# Altium schematic symbol library lib_datalogger.SchLib: 1246 symbols (part 6 of 16)
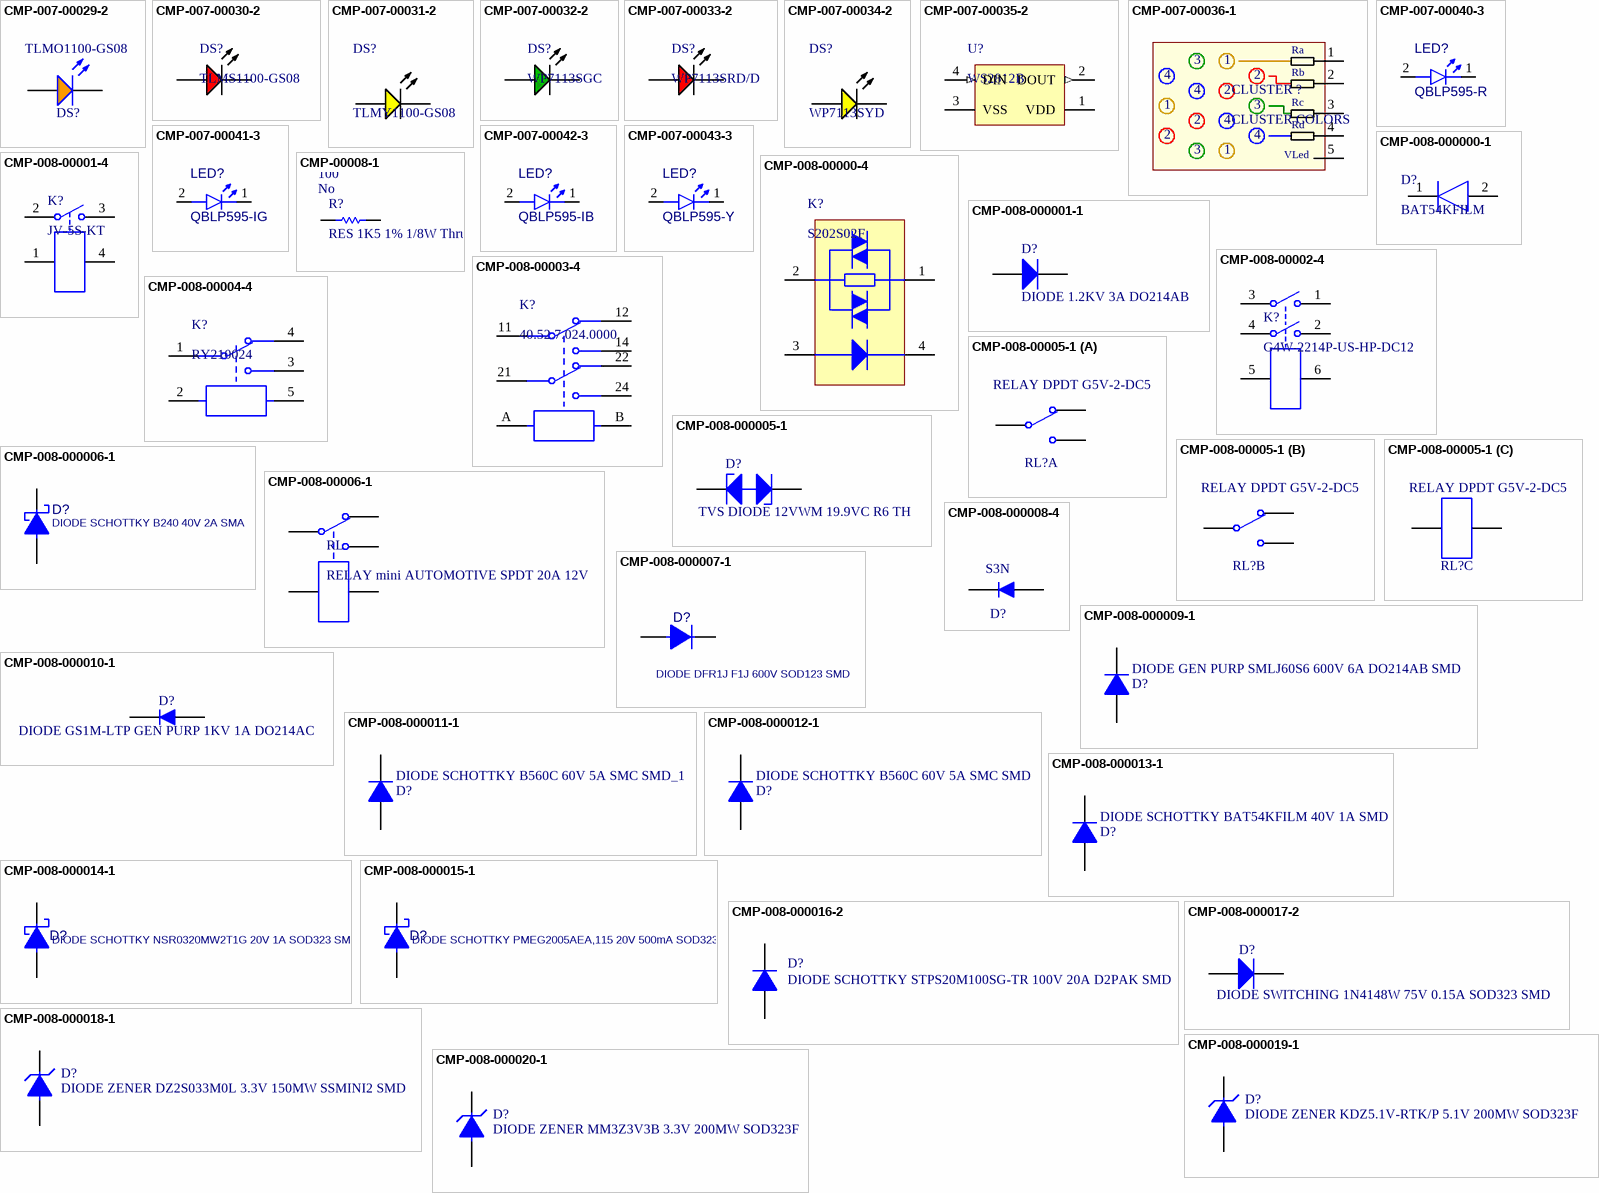
[diagram p48: symbols CMP-007-00029-2 to CMP-008-000020-1]

## CMP-008-000017-2
designator D?, comment DIODE SWITCHING 1N4148W 75V 0.15A SOD323 SMD
DIODE GEN PURP 75V 150MA SOD323; Manufacturer: Micro Commercial Co; Manufacturer Part Number: 1N4148WX-TP; Polarity: Standard; Reverse Recovery Time: 4ns; Power Dissipation: 500mW; Voltage - Forward (Vf) (Max) @ If: 1V @ 50mA; Current - Reverse Leakage @ Vr: 5µA @ 75V; Power Rating: 200mW; Peak Non-Repetitive Surge Current: 350mA; Max Repetitive Reverse Voltage (Vrrm): 100V; Max Reverse Current: 100uA; Speed: Small Signal =< 200mA (Io), Any Speed; Element Configuration: Single; Capacitance: 2pF; Forward Voltage: 1.2V; Forward Current: 150mA; ComponentLink6Description: https://datasheet.ciiva.com/28513/1749643-28513431.pdf?src-supplier=Element14; ComponentLink13Description: https://datasheet.ciiva.com/911/ds30097-911741.pdf?src-supplier=Digi-Key; ComponentLink1Description: http://www.mccsemi.com/up_pdf/1N4148WX(SOD323).pdf; ComponentLink5Description: https://datasheet.ciiva.com/29593/1n4148ws-29593110.pdf?src-supplier=Digi-Key; Weight: 0.000152oz; Package Quantity: 3000; ComponentLink13URL: https://datasheet.ciiva.com/911/ds30097-911741.pdf?src-supplier=Digi-Key; Current - Average Rectified (Io): 150mA; Voltage Rating (DC): 75V; Supplier Device Package: SOD-323; ComponentLink10Description: https://datasheet.ciiva.com/16472/ds30097-16472599.pdf?src-supplier=Avnet+Asia; Current Rating: 150mA; ComponentLink14Description: https://datasheet.ciiva.com/911/ds30097-911742.pdf?src-supplier=Digi-Key; Max Operating Temperature: 150°C; RoHS: RoHS Compliant; Pricing 2: 3000=0,03390, 6000=0,02700, 12000=0,02300, 1=0,11530, 10=0,10420, 25=0,09810, 100=0,06020, 250=0,05940, 500=0,05090, 1000=0,04270, 3000=0,02700 (USD); Packaging: Cut Tape (CT); REACH SVHC: Unknown; ComponentLink11URL: https://datasheet.ciiva.com/1179/ds30097-1179355.pdf?src-supplier=Element14; Lead Free: Lead Free; ComponentLink7Description: https://datasheet.ciiva.com/29885/1n4148ws-29885946.pdf?src-supplier=Avnet; Number of Pins: 2; Recovery Time: 4ns; ComponentLink12URL: https://datasheet.ciiva.com/8300/ds30097-8300396.pdf?src-supplier=Avnet; Radiation Hardening: No; Voltage: 75V; ComponentLink16URL: https://datasheet.ciiva.com/911/ds30097-911743.pdf?src-supplier=Digi-Key; ComponentLink11Description: https://datasheet.ciiva.com/1179/ds30097-1179355.pdf?src-supplier=Element14; Reverse Recovery Time (trr): 4ns; Width: 1.5mm; Category: Discrete Semiconductor Products; ComponentLink15Description: https://datasheet.ciiva.com/25946/ds30097-25946926.pdf?src-supplier=Avnet+Europe; ComponentLink10URL: https://datasheet.ciiva.com/16472/ds30097-16472599.pdf?src-supplier=Avnet+Asia; ComponentLink14URL: https://datasheet.ciiva.com/911/ds30097-911742.pdf?src-supplier=Digi-Key; Capacitance @ Vr, F: -; Design Item ID: DIODE SWITCHING 1N4148W 75V 0.15A SOD323 SMD; Diode Type: Standard; Height: 1.05mm; ComponentLink15URL: https://datasheet.ciiva.com/25946/ds30097-25946926.pdf?src-supplier=Avnet+Europe; ComponentLink8URL: https://datasheet.ciiva.com/24156/1n4148ws-24156957.pdf?src-supplier=Future+Electronics; ComponentLink12Description: https://datasheet.ciiva.com/8300/ds30097-8300396.pdf?src-supplier=Avnet; ComponentLink6URL: https://datasheet.ciiva.com/28513/1749643-28513431.pdf?src-supplier=Element14; ComponentLink3URL: https://datasheet.ciiva.com/26946/getdatasheetpartid-790118-26946365.pdf?src-supplier=Verical; ComponentLink9URL: https://datasheet.ciiva.com/16199/ds30097-16199061.pdf?src-supplier=Future+Electronics; Part Status: Active; ComponentLink2Description: https://datasheet.ciiva.com/28513/1749643-28513441.pdf?src-supplier=Element14; Stock 1: 606017; ComponentLink9Description: https://datasheet.ciiva.com/16199/ds30097-16199061.pdf?src-supplier=Future+Electronics; Average Rectified Current: 150mA; Pricing 1: 1=0,17000, 10=0,14500, 100=0,06860, 500=0,04068, 1000=0,02731 (USD); Output Current: 150mA; Contact Plating: Tin; ComponentLink8Description: https://datasheet.ciiva.com/24156/1n4148ws-24156957.pdf?src-supplier=Future+Electronics; Operating Temperature - Junction: -55°C ~ 150°C; Length: 1.95mm; Mounting Type: Surface Mount; Max Forward Surge Current (Ifsm): 350mA; Package / Case: SC-76, SOD-323; Max Power Dissipation: 200mW; Min Operating Temperature: -55°C; Voltage - DC Reverse (Vr) (Max): 75V; Source: mits.SchLib; Max Reverse Voltage (DC): 75V; Case/Package: SMA; ComponentLink3Description: https://datasheet.ciiva.com/26946/getdatasheetpartid-790118-26946365.pdf?src-supplier=Verical; ComponentLink4URL: https://datasheet.ciiva.com/29593/1n4148ws-29593109.pdf?src-supplier=Digi-Key; Max Surge Current: 350mA; Max Reverse Leakage Current: 100uA; ComponentLink1URL: http://www.mccsemi.com/up_pdf/1N4148WX(SOD323).pdf; ComponentLink7URL: https://datasheet.ciiva.com/29885/1n4148ws-29885946.pdf?src-supplier=Avnet; ComponentLink4Description: https://datasheet.ciiva.com/29593/1n4148ws-29593109.pdf?src-supplier=Digi-Key; Stock 2: 12000; ComponentLink16Description: https://datasheet.ciiva.com/911/ds30097-911743.pdf?src-supplier=Digi-Key; Mount: Surface Mount; ComponentLink5URL: https://datasheet.ciiva.com/29593/1n4148ws-29593110.pdf?src-supplier=Digi-Key; ComponentLink2URL: https://datasheet.ciiva.com/28513/1749643-28513441.pdf?src-supplier=Element14
footprint SOD-323
footprint SOD-323
pins: A, K

## CMP-008-000018-1
designator D?, comment DIODE ZENER DZ2S033M0L 3.3V 150MW SSMINI2 SMD
DIODE ZENER 3.3V 150MW SSMINI2; Manufacturer: Panasonic Electronic Components; Voltage - Forward (Vf) (Max) @ If: 1V @ 10mA; Impedance (Max) (Zzt): 130 Ohm; Tolerance: ±2.5%; Current - Reverse Leakage @ Vr: 20µA @ 1V; Voltage - Zener (Nom) (Vz): 3.3V; Manufacturer Part Number: DZ2S033M0L; Operating Temperature: -; Category: Discrete Semiconductor Products; ComponentLink1URL: http://www.semicon.panasonic.co.jp/ds4/DZ2S033_E.pdf; Design Item ID: DIODE ZENER DZ2S033M0L 3.3V 150MW SSMINI2 SMD; RoHS: RoHS Compliant; ComponentLink1Description: http://www.semicon.panasonic.co.jp/ds4/DZ2S033_E.pdf; Part Status: Active; Mounting Type: Surface Mount; Supplier Device Package: SSMini2-F5-B; Stock 1: 9938; Pricing 1: 1=0.1, 10=0.044, 25=0.0356, 100=0.0277, 250=0.02692, 500=0.02614, 1000=0.02376 (USD); Package / Case: SC-79, SOD-523; Power - Max: 150mW; Packaging: Cut Tape (CT); Source: mits.SchLib
footprint SOD-323
footprint SC-79, SOD-523
pins: A "Anode", K "Catode"

## CMP-008-000019-1
designator D?, comment DIODE ZENER KDZ5.1V-RTK/P 5.1V 200MW SOD323F
DIODE ZENER 5.1V 200MW SOD323F; Manufacturer 1: KEC; Impedance: 70R; Zener Current: 5mA; Peak Reverse Current: 1.5uA; Voltage Tolerance: 2.16%; Height: 1.05mm; Length: 2.5mm; ComponentLink1Description: https://datasheet.lcsc.com/szlcsc/KEC-Semicon-KDZ5-1V-RTK-P_C155471.pdf; Design Item ID: DIODE ZENER KDZ5.1V-RTK/P 5.1V 200MW SOD323F; Category: Zener Diodes; RoHS: Yes; Min Operating Temperature: -55°C; Power Rating: 200mW; Manufacturer Part Number 1: KDZ5.1V-RTK/P; Source: mits.SchLib; Max Operating Temperature: 150°C; Number of Pins: 2; Termination: SMD/SMT; Width: 1.3mm; REACH SVHC: No SVHC; Max Power Dissipation: 200mW; Case/Package: SOD-323F; Max Reverse Leakage Current: 1.5uA; ComponentLink1URL: https://datasheet.lcsc.com/szlcsc/KEC-Semicon-KDZ5-1V-RTK-P_C155471.pdf; Mount: Surface Mount; Zener Voltage: 5.1V
footprint SOD-323
footprint SOD-323
pins: A "Anode", K "Catode"

## CMP-008-000020-1
designator D?, comment DIODE ZENER MM3Z3V3B 3.3V 200MW SOD323F
DIODE ZENER 3.3V 200MW SOD323F; Manufacturer: Fairchild/ON Semiconductor; Voltage - Forward (Vf) (Max) @ If: 1V @ 10mA; Impedance (Max) (Zzt): 89 Ohm; Current - Reverse Leakage @ Vr: 4.5µA @ 1V; Tolerance: ±2%; Pricing 1: 1=0.2, 10=0.18, 100=0.098, 500=0.06028, 1000=0.0411 (USD); RoHS: RoHS Compliant; Source: mits.SchLib; Stock 1: 42346; Manufacturer Part Number: MM3Z3V3B; Voltage - Zener (Nom) (Vz): 3.3V; Part Status: Active; Operating Temperature: -65°C ~ 150°C; Mounting Type: Surface Mount; Design Item ID: DIODE ZENER MM3Z3V3B 3.3V 200MW SOD323F; Package / Case: SC-90, SOD-323F; Power - Max: 200mW; Category: Discrete Semiconductor Products; ComponentLink1Description: https://www.fairchildsemi.com/datasheets/MM/MM3Z10VB.pdf; Supplier Device Package: SOD-323F; Packaging: Cut Tape (CT); ComponentLink1URL: https://www.fairchildsemi.com/datasheets/MM/MM3Z10VB.pdf
footprint SOD-323
footprint SOD-323
pins: A "Anode", K "Catode"

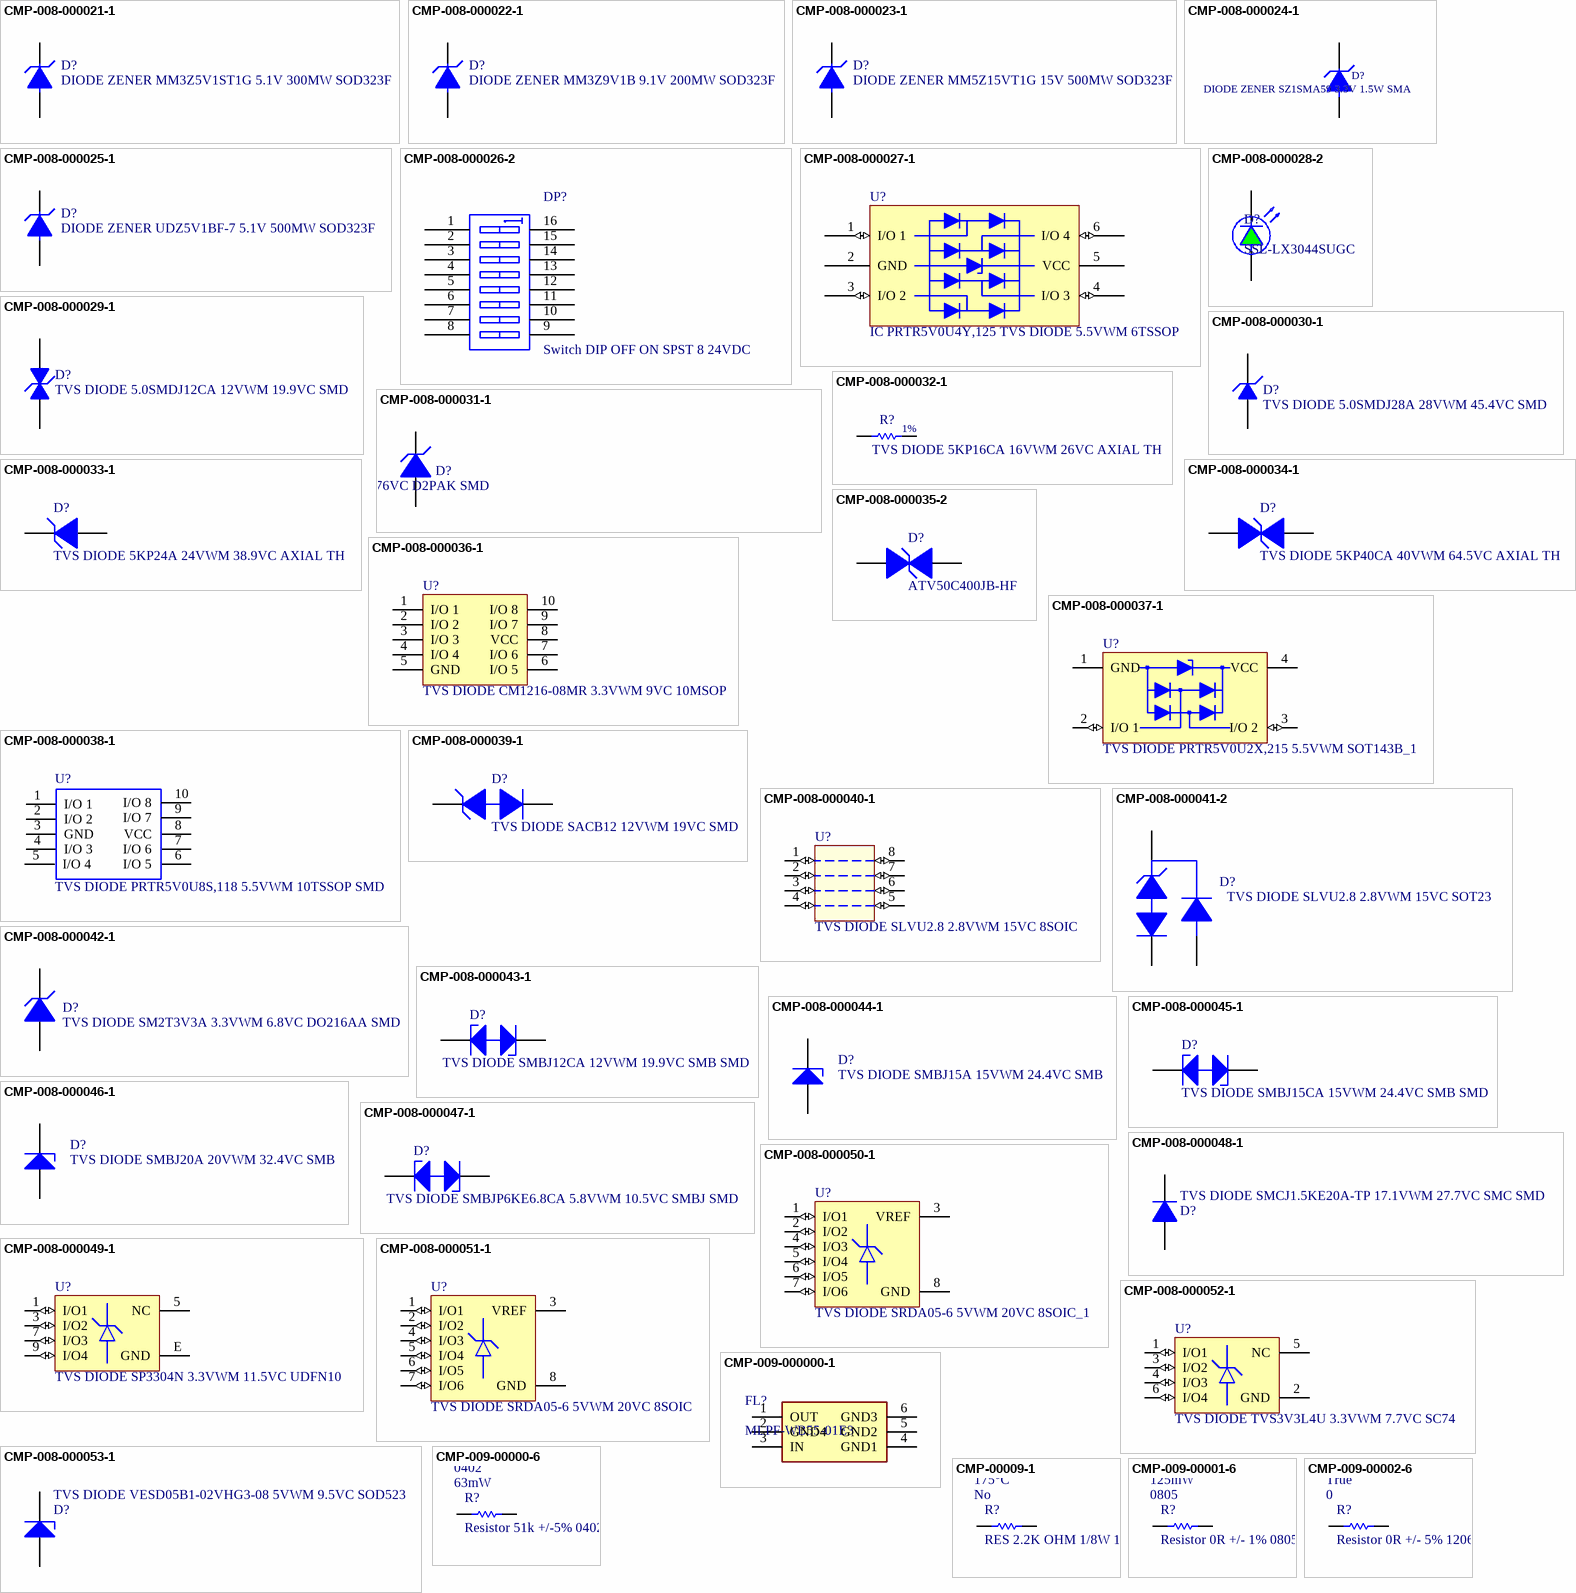
[diagram p16: symbols CMP-008-000021-1 to CMP-009-00002-6]

## CMP-008-000021-1
designator D?, comment DIODE ZENER MM3Z5V1ST1G 5.1V 300MW SOD323F
DIODE ZENER 5.1V 300MW SOD323; Manufacturer: ON Semiconductor; Voltage Tolerance: 2%; Forward Voltage: 900mV; Max Power Dissipation: 200mW; Zener Current: 10mA; Impedance: 60R; ESD Protection: Yes; Element Configuration: Single; Max Reverse Leakage Current: 2uA; Zener Voltage: 5.09V; Test Current: 5mA; Material: Plastic; ComponentLink5URL: https://datasheet.ciiva.com/16473/mm3z2v4st1-d-16473517.pdf?src-supplier=Avnet+Asia; ComponentLink3URL: https://datasheet.ciiva.com/894/mm3z2v4st1-d-894648.pdf?src-supplier=Digi-Key; ComponentLink4Description: https://datasheet.ciiva.com/22626/1878251-22626906.pdf?src-supplier=Element14; Stock 1: 140661; ComponentLink4URL: https://datasheet.ciiva.com/22626/1878251-22626906.pdf?src-supplier=Element14; ComponentLink5Description: https://datasheet.ciiva.com/16473/mm3z2v4st1-d-16473517.pdf?src-supplier=Avnet+Asia; Package Quantity: 3000; Radiation Hardening: No; Source: mits.SchLib; REACH SVHC: No SVHC; Power Dissipation: 200mW; Width: 1.35mm; Length: 1.8mm; Power Rating: 200mW; ComponentLink9URL: https://datasheet.ciiva.com/22626/1878251-22626909.pdf?src-supplier=Element14; Packaging: Tape and Reel; Max Operating Temperature: 150°C; ComponentLink9Description: https://datasheet.ciiva.com/22626/1878251-22626909.pdf?src-supplier=Element14; Height: 1mm; Voltage Rating (DC): 5.1V; RoHS: Yes; ComponentLink8Description: https://datasheet.ciiva.com/16397/mm3z2v4st1-d-16397690.pdf?src-supplier=Future+Electronics; Design Item ID: DIODE ZENER MM3Z5V1ST1G 5.1V 300MW SOD323F; ComponentLink7URL: https://datasheet.ciiva.com/25928/mm3z2v4st1-d-25928233.pdf?src-supplier=Avnet+Europe; ComponentLink1URL: https://datasheet.ciiva.com/10630/mm3z2v4st1-d-10630224.pdf?src-supplier=Avnet; Manufacturer Part Number: MM3Z5V1ST1G; ComponentLink6Description: https://datasheet.ciiva.com/894/mm3z2v4st1-d-894647.pdf?src-supplier=Digi-Key; ComponentLink2URL: https://datasheet.ciiva.com/894/mm3z2v4st1-d-894646.pdf?src-supplier=Digi-Key; ComponentLink1Description: https://datasheet.ciiva.com/10630/mm3z2v4st1-d-10630224.pdf?src-supplier=Avnet; Lead Free: Lead Free; Case/Package: SOD-323-2; Number of Pins: 2; Pricing 1: 1=0,13000, 10=0,12200, 100=0,05100, 500=0,04004, 1000=0,02781 (USD); Category: Zener Diodes; ComponentLink8URL: https://datasheet.ciiva.com/16397/mm3z2v4st1-d-16397690.pdf?src-supplier=Future+Electronics; ComponentLink2Description: https://datasheet.ciiva.com/894/mm3z2v4st1-d-894646.pdf?src-supplier=Digi-Key; ComponentLink7Description: https://datasheet.ciiva.com/25928/mm3z2v4st1-d-25928233.pdf?src-supplier=Avnet+Europe; ComponentLink6URL: https://datasheet.ciiva.com/894/mm3z2v4st1-d-894647.pdf?src-supplier=Digi-Key; Working Voltage: 5.1V; Contact Plating: Tin,Matte; Min Operating Temperature: -65°C; ComponentLink3Description: https://datasheet.ciiva.com/894/mm3z2v4st1-d-894648.pdf?src-supplier=Digi-Key; Peak Reverse Current: 2uA; Tolerance: 2%
footprint SOD-323
footprint SOD-323
pins: A "Anode", K "Catode"

## CMP-008-000022-1
designator D?, comment DIODE ZENER MM3Z9V1B 9.1V 200MW SOD323F
DIODE ZENER 9.1V 200MW SOD323F; Manufacturer: Fairchild/ON Semiconductor; Test Current: 5mA; Max Reverse Leakage Current: 450nA; Element Configuration: Single; Current - Reverse Leakage @ Vr: 4.5µA @ 6V; Tolerance: ±2%; Voltage Tolerance: 2%; Impedance: 14R; Voltage - Forward (Vf) (Max) @ If: 1V @ 10mA; Impedance (Max) (Zzt): 14 Ohms; ComponentLink1Description: https://www.fairchildsemi.com/datasheets/MM/MM3Z10VB.pdf; ComponentLink5Description: https://datasheet.ciiva.com/889/mm3z10vb-889110.pdf?src-supplier=Digi-Key; Source: mits.SchLib; Stock 2: 230; Operating Temperature: -65°C ~ 150°C; Package Quantity: 1; Min Operating Temperature: -65°C; Pricing 1: 1=0,24000, 10=0,19400, 100=0,10270, 500=0,06758, 1000=0,04595 (USD); Max Power Dissipation: 200mW; Category: Discrete Semiconductor Products; ComponentLink4URL: https://datasheet.ciiva.com/10639/mm3z9v1b-10639643.pdf?src-supplier=Avnet; ComponentLink3Description: https://datasheet.ciiva.com/889/mm3z10vb-889112.pdf?src-supplier=Digi-Key; Part Status: Active; Package / Case: SC-90, SOD-323F; Mount: Surface Mount; Radiation Hardening: No; Max Operating Temperature: 150°C; Number of Pins: 2; RoHS Compliant: Yes; Design Item ID: DIODE ZENER MM3Z9V1B 9.1V 200MW SOD323F; ComponentLink2URL: https://datasheet.ciiva.com/4732/mm3z9v1b-186818-4732865.pdf?src-supplier=Mouser; Power Dissipation: 200mW; ComponentLink6Description: https://datasheet.ciiva.com/889/mm3z10vb-889111.pdf?src-supplier=Digi-Key; Width: 1.7mm; Pricing 2: 1=0,24000, 10=0,19400, 100=0,10270, 500=0,06758, 1000=0,04595 (USD); ComponentLink6URL: https://datasheet.ciiva.com/889/mm3z10vb-889111.pdf?src-supplier=Digi-Key; RoHS: RoHS Compliant; Length: 1.3mm; Height: 1mm; Voltage - Zener (Nom) (Vz): 9.1V; Manufacturer Part Number: MM3Z9V1B; Packaging: Cut Tape (CT); Supplier Device Package: SOD-323F; ComponentLink1URL: https://www.fairchildsemi.com/datasheets/MM/MM3Z10VB.pdf; Series: MM3Z9; Stock 1: 230; ComponentLink4Description: https://datasheet.ciiva.com/10639/mm3z9v1b-10639643.pdf?src-supplier=Avnet; ComponentLink5URL: https://datasheet.ciiva.com/889/mm3z10vb-889110.pdf?src-supplier=Digi-Key; Power - Max: 200mW; Mounting Type: Surface Mount; ComponentLink2Description: https://datasheet.ciiva.com/4732/mm3z9v1b-186818-4732865.pdf?src-supplier=Mouser; ComponentLink3URL: https://datasheet.ciiva.com/889/mm3z10vb-889112.pdf?src-supplier=Digi-Key; Zener Voltage: 9.1V; REACH SVHC: No SVHC; Weight: 0.0276g
footprint SOD-323
footprint SOD-323
pins: A "Anode", K "Catode"

## CMP-008-000023-1
designator D?, comment DIODE ZENER MM5Z15VT1G 15V 500MW SOD323F
Diode Zener Single 14.7V 5% 550mW Automotive 2-Pin SOD-323F T/R; Manufacturer: ON Semiconductor; Max Reverse Leakage Current: 50nA; Material: Plastic; ESD Protection: Yes; Zener Current: 10mA; Power Rating: 100mW; Impedance: 30R; Max Power Dissipation: 200mW; Forward Voltage: 900mV; Test Current: 5mA; ComponentLink12URL: https://datasheet.ciiva.com/892/bzx84j-ser-892483.pdf?src-supplier=Digi-Key; Voltage Rating (DC): 15V; Packaging: Tape and Reel; Voltage Tolerance: 5%; Width: 0.9mm; Voltage: 15V; Package Quantity: 3000; RoHS: Yes; ComponentLink7URL: https://datasheet.ciiva.com/895/mm5z2v4t1-d-895143.pdf?src-supplier=Digi-Key; Max Reverse Current: 50nA; ComponentLink7Description: https://datasheet.ciiva.com/895/mm5z2v4t1-d-895143.pdf?src-supplier=Digi-Key; ComponentLink8URL: https://datasheet.ciiva.com/895/mm5z2v4t1-d-895144.pdf?src-supplier=Digi-Key; ComponentLink2URL: https://datasheet.ciiva.com/15142/getdatasheetpartid-39000-15142029.pdf?src-supplier=Verical; ComponentLink1Description: https://www.fairchildsemi.com/datasheets/MM/MM3Z10VB.pdf; ComponentLink8Description: https://datasheet.ciiva.com/895/mm5z2v4t1-d-895144.pdf?src-supplier=Digi-Key; Tolerance: 5%; Number of Pins: 2; Pricing 2: 1=0,23000, 10=0,19000, 100=0,10070, 500=0,06626, 1000=0,04506 (USD); ComponentLink13URL: https://datasheet.ciiva.com/16473/bzx84j-ser-16473676.pdf?src-supplier=Avnet+Asia; Working Voltage: 15V; ComponentLink13Description: https://datasheet.ciiva.com/16473/bzx84j-ser-16473676.pdf?src-supplier=Avnet+Asia; ComponentLink10URL: https://datasheet.ciiva.com/892/bzx84j-ser-892482.pdf?src-supplier=Digi-Key; ComponentLink12Description: https://datasheet.ciiva.com/892/bzx84j-ser-892483.pdf?src-supplier=Digi-Key; Case/Package: SOD-523-2; Stock 2: 5714; ComponentLink4Description: https://datasheet.ciiva.com/26092/mm5z2v4t1-d-26092189.pdf?src-supplier=Avnet+Europe; REACH SVHC: No SVHC; Max Operating Temperature: 150°C; ComponentLink3Description: https://datasheet.ciiva.com/16206/mm5z2v4t1-d-16206007.pdf?src-supplier=Future+Electronics; ComponentLink11URL: https://datasheet.ciiva.com/892/bzx84j-ser-892481.pdf?src-supplier=Digi-Key; ComponentLink3URL: https://datasheet.ciiva.com/16206/mm5z2v4t1-d-16206007.pdf?src-supplier=Future+Electronics; ComponentLink4URL: https://datasheet.ciiva.com/26092/mm5z2v4t1-d-26092189.pdf?src-supplier=Avnet+Europe; Zener Voltage: 15V; Length: 1.3mm; ComponentLink5Description: https://datasheet.ciiva.com/4731/mm5z2v4t1-d-4731183.pdf?src-supplier=Mouser; ComponentLink10Description: https://datasheet.ciiva.com/892/bzx84j-ser-892482.pdf?src-supplier=Digi-Key; Power Dissipation: 200mW; ComponentLink5URL: https://datasheet.ciiva.com/4731/mm5z2v4t1-d-4731183.pdf?src-supplier=Mouser; ComponentLink6Description: https://datasheet.ciiva.com/895/mm5z2v4t1-d-895142.pdf?src-supplier=Digi-Key; Mount: Surface Mount; Source: mits.SchLib; Design Item ID: DIODE ZENER MM5Z15VT1G 15V 500MW SOD323F; Peak Reverse Current: 50nA; Radiation Hardening: No; ComponentLink9URL: https://datasheet.ciiva.com/8347/mm5z2v4t1-d-8347806.pdf?src-supplier=Avnet; ComponentLink11Description: https://datasheet.ciiva.com/892/bzx84j-ser-892481.pdf?src-supplier=Digi-Key; Height: 0.7mm; Element Configuration: Single; Lead Free: Lead Free; Pricing 1: 1=0,22000, 10=0,17700, 100=0,07250, 500=0,06048, 1000=0,04202 (USD); Manufacturer Part Number: MM5Z15VT1G; ComponentLink9Description: https://datasheet.ciiva.com/8347/mm5z2v4t1-d-8347806.pdf?src-supplier=Avnet; ComponentLink2Description: https://datasheet.ciiva.com/15142/getdatasheetpartid-39000-15142029.pdf?src-supplier=Verical; ComponentLink6URL: https://datasheet.ciiva.com/895/mm5z2v4t1-d-895142.pdf?src-supplier=Digi-Key; Min Operating Temperature: -65°C; Category: Zener Diodes; ComponentLink1URL: https://www.fairchildsemi.com/datasheets/MM/MM3Z10VB.pdf; Contact Plating: Tin,Matte; Stock 1: 107647
footprint SOD-323
footprint SOD-323
pins: A "Anode", K "Catode"

## CMP-008-000024-1
designator D?, comment DIODE ZENER SZ1SMA59 3.3V 1.5W SMA
ON SEMICONDUCTOR - SZ1SMA5918BT3G - Zener Single Diode, 5.1 V, 1.5 W, DO-214AC, 5 %, 2 Pins, 150 °C; Voltage Tolerance: 5%; Impedance: 4R; Zener Voltage: 5.1V; Max Reverse Leakage Current: 2.5uA; Pricing 1: 1=0,30890, 10=0,23150, 30=0,21740, 100=0,20320, 500=0,19690, 1000=0,19380, 1=0,29600, 10=0,22180, 30=0,20830, 100=0,19460, 500=0,18860, 1000=0,18560, 1=1,55170, 10=1,16300, 30=1,09200, 100=1,02050, 500=0,98890, 1000=0,97320, 1=1,48840, 10=1,11550, 30=1,04750, 100=0,97880, 500=0,94860, 1000=0,93350, 1=0,20010, 10=0,14990, 30=0,14080, 100=0,13160, 500=0,12750, 1000=0,12550, 1=0,17000, 10=0,12740, 30=0,11960, 100=0,11180, 500=0,10830, 1000=0,10660, 1=1,83740, 10=1,37710, 30=1,29310, 100=1,20830, 500=1,17100, 1000=1,15240, 1=26,04950, 10=19,52330, 30=18,33270, 100=17,13110, 500=16,60200, 1000=16,33740, 1=0,97730, 10=0,73250, 30=0,68780, 100=0,64270, 500=0,62290, 1000=0,61300, 1=18,08770, 10=13,55620, 30=12,72950, 100=11,89520, 500=11,52770, 1000=11,34400, 1=2,05790, 10=1,54240, 30=1,44830, 100=1,35340, 500=1,31160, 1000=1,29070, 1=0,31700, 10=0,23760, 30=0,22310, 100=0,20850, 500=0,20200, 1000=0,19880, 1=0,23630, 10=0,17710, 30=0,16630, 100=0,15540, 500=0,15060, 1000=0,14820 (AUD); Radiation Hardening: No; Series: -; ComponentLink1URL: https://datasheet.ciiva.com/354/1sma5913bt3-d-354340.pdf?src-supplier=Digi-Key; Lead Free: Lead Free; ComponentLink1Description: https://datasheet.ciiva.com/354/1sma5913bt3-d-354340.pdf?src-supplier=Digi-Key; ComponentLink2Description: https://datasheet.ciiva.com/13076/1sma5913bt3-d-13076302.pdf?src-supplier=Mouser; Stock 1: 5455; Tolerance: 5%; Package Quantity: 5000; Category: Zener Diodes; Min Operating Temperature: -65°C; Element Configuration: Single; Pricing 2: 1=0,30890, 10=0,23150, 30=0,21740, 100=0,20320, 500=0,19690, 1000=0,19380, 1=0,29600, 10=0,22180, 30=0,20830, 100=0,19460, 500=0,18860, 1000=0,18560, 1=1,55170, 10=1,16300, 30=1,09200, 100=1,02050, 500=0,98890, 1000=0,97320, 1=1,48840, 10=1,11550, 30=1,04750, 100=0,97880, 500=0,94860, 1000=0,93350, 1=0,20010, 10=0,14990, 30=0,14080, 100=0,13160, 500=0,12750, 1000=0,12550, 1=0,17000, 10=0,12740, 30=0,11960, 100=0,11180, 500=0,10830, 1000=0,10660, 1=1,83740, 10=1,37710, 30=1,29310, 100=1,20830, 500=1,17100, 1000=1,15240, 1=26,04950, 10=19,52330, 30=18,33270, 100=17,13110, 500=16,60200, 1000=16,33740, 1=0,97730, 10=0,73250, 30=0,68780, 100=0,64270, 500=0,62290, 1000=0,61300, 1=18,08770, 10=13,55620, 30=12,72950, 100=11,89520, 500=11,52770, 1000=11,34400, 1=2,05790, 10=1,54240, 30=1,44830, 100=1,35340, 500=1,31160, 1000=1,29070, 1=0,31700, 10=0,23760, 30=0,22310, 100=0,20850, 500=0,20200, 1000=0,19880, 1=0,23630, 10=0,17710, 30=0,16630, 100=0,15540, 500=0,15060, 1000=0,14820 (AUD); Manufacturer: ON Semiconductor; ComponentLink2URL: https://datasheet.ciiva.com/13076/1sma5913bt3-d-13076302.pdf?src-supplier=Mouser; Source: mits.SchLib; ComponentLink3Description: https://datasheet.ciiva.com/10638/1sma5913bt3-d-10638907.pdf?src-supplier=Avnet; RoHS: Yes; RoHS Compliant: Yes; Number of Pins: 2; Packaging: Tape and Reel; Manufacturer Part Number: SZ1SMA5918BT3G; Case/Package: SMA; Max Operating Temperature: 150°C; Halogen Free: Halogen Free; Design Item ID: DIODE ZENER SZ1SMA59 3.3V 1.5W SMA; ComponentLink3URL: https://datasheet.ciiva.com/10638/1sma5913bt3-d-10638907.pdf?src-supplier=Avnet; Max Power Dissipation: 1.5W
footprint DIOM4326X22N (Molded Diode, 2-Leads, Body 4,31x2,61mm, IPC Medium Density)
footprint DIOM4326X22N (Molded Diode, 2-Leads, Body 4,31x2,61mm, IPC Medium Density)
pins: 1 K "Catode", 2 A "Anode"

## CMP-008-000025-1
designator D?, comment DIODE ZENER UDZ5V1BF-7 5.1V 500MW SOD323F
DIODE ZENER 5.1V 500MW SOD323F; Manufacturer: Diodes; Max Reverse Leakage Current: 2uA; Voltage Tolerance: 2.16%; Impedance: 80R; Tolerance: 2%; Element Configuration: Single; Number of Pins: 2; Packaging: Tape and Reel; ComponentLink2URL: https://datasheet.ciiva.com/8348/ds32228-8348410.pdf?src-supplier=Avnet; Manufacturer Part Number: UDZ5V1BF-7; Power Rating: 500mW; Max Operating Temperature: 150°C; Design Item ID: DIODE ZENER UDZ5V1BF-7 5.1V 500MW SOD323F; Peak Reverse Current: 2uA; Termination: SMD/SMT; Mount: Surface Mount; Height: 1.05mm; Source: mits.SchLib; Radiation Hardening: No; Length: 2.5mm; Category: Zener Diodes; RoHS: Yes; Min Operating Temperature: -65°C; Package Quantity: 3000; Pricing 1: 1=0,34000, 10=0,25000, 100=0,11860, 500=0,09672, 1000=0,07176 (USD); ComponentLink2Description: https://datasheet.ciiva.com/8348/ds32228-8348410.pdf?src-supplier=Avnet; Stock 1: 7637; ComponentLink1URL: https://datasheet.ciiva.com/13063/ds32228-26313-13063761.pdf?src-supplier=Mouser; ComponentLink3Description: https://datasheet.ciiva.com/18567/ds32228-18567770.pdf?src-supplier=Digi-Key; REACH SVHC: No SVHC; Case/Package: SOD-323-2; Zener Voltage: 5.1V; Max Power Dissipation: 500mW; ComponentLink1Description: https://datasheet.ciiva.com/13063/ds32228-26313-13063761.pdf?src-supplier=Mouser; Zener Current: 2uA; Width: 1.3mm; ComponentLink3URL: https://datasheet.ciiva.com/18567/ds32228-18567770.pdf?src-supplier=Digi-Key
footprint SOD-323
footprint SOD-323
pins: A "Anode", K "Catode"

## CMP-008-000026-2
designator DP?, comment Switch DIP OFF ON SPST 8 24VDC
Switch DIP OFF ON SPST 8 Raised Slide 0.05A 24VDC PC Pins 10000Cycles 2.54mm Thru-Hole Tube; Max Current Rating: 50mA; Number of Positions: 8; Actuator Type: Slide (Standard); Pitch: 0.1inch; Voltage Rating (DC): 24V; Washable: No; Body Material: Plastic; Contact Plating: Gold,Tin; Packaging: Rail/Tube; Mount: Through Hole; Length: 0.886inch; Radiation Hardening: No; Electrical Life: 10000Cycles; Termination: PC Pin; Contact Material: Copper Alloy; Orientation: Straight; Throw Configuration: SPST; Min Operating Temperature: -55°C; Terminal Pitch: 2.54mm; Lead Free: Lead Free; Package Quantity: 25; Series: 206; Current Rating: 50mA; Depth: 9.78mm; Max Operating Temperature: 85°C; RoHS Compliant: Yes
footprint DIP-16_VERT_TH (DIP; 16 Leads; Row Spacing 7.62 mm; Pitch 2.54 mm)
footprint DIP-16_VERT_TH (DIP; 16 Leads; Row Spacing 7.62 mm; Pitch 2.54 mm)
pins: 1, 2, 3, 4, 5, 6, 7, 8, 9, 10, 11, 12, 13, 14, 15, 16

## CMP-008-000027-1
designator U?, comment IC PRTR5V0U4Y,125 TVS DIODE 5.5VWM 6TSSOP
TVS DIODE 5.5VWM 6TSSOP; Manufacturer: NXP Semiconductors; eVendor: Digi-Key; eVendor#: 568-6542-1-ND; eVendorPrice: 0,48; MSRP: 0,13228; Design Item ID: IC PRTR5V0U4Y,125 TVS DIODE 5.5VWM 6TSSOP; Part#: PRTR5V0U4Y,125; Source: mits.SchLib; MOQ: 1000; Datasheet: http://www.nxp.com/documents/data_sheet/PRTR5V0U4Y.pdf
footprint 6-TSSOP
footprint 6-TSSOP
pins: 1 I/O 1 (io), 2 GND (power), 3 I/O 2 (io), 4 I/O 3 (io), 5 VCC (power), 6 I/O 4 (io)

## CMP-008-000028-2
designator D?, comment SSL-LX3044SUGC